# Altium footprint library LHAC-4XDSP2XV7-VP5_0226_3.PcbLib: 96 footprints (part 5 of 12)
Each footprint in its own frame and in the unit in brackets; x right, y up, seen from the top. Pads: shape width x height; smd on the part's side, far side on the other; paste and mask are expansions set on the pad; w line width, h text height; cw(c..) or ccw(c..) is an arc to the next point about the centre after c.
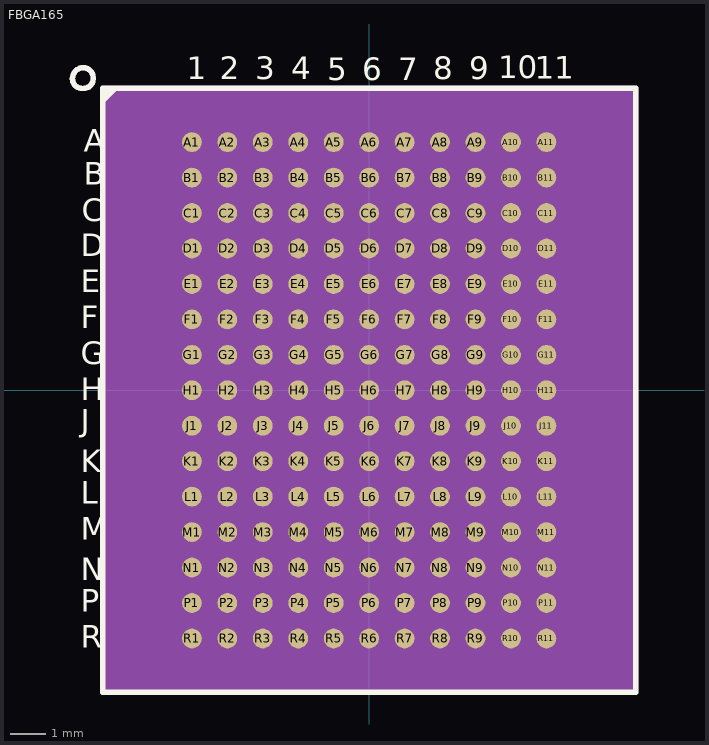
[diagram p4: the footprint, top view; thin cyan lines are the x and y axes]

## FBGA165 [mil] "FBGA165"
pads (165):
  round 22 smd: A1(-196.85,275.59) A2(-157.48,275.59) A3(-118.11,275.59) A4(-78.74,275.59) A5(-39.37,275.59) A6(0,275.59) A7(39.37,275.59) A8(78.74,275.59) A9(118.11,275.59) A10(157.48,275.59) A11(196.85,275.59) B1(-196.85,236.22) B2(-157.48,236.22) B3(-118.11,236.22) B4(-78.74,236.22) B5(-39.37,236.22) B6(0,236.22) B7(39.37,236.22) B8(78.74,236.22) B9(118.11,236.22) B10(157.48,236.22) B11(196.85,236.22) C1(-196.85,196.85) C2(-157.48,196.85) C3(-118.11,196.85) C4(-78.74,196.85) C5(-39.37,196.85) C6(0,196.85) C7(39.37,196.85) C8(78.74,196.85) C9(118.11,196.85) C10(157.48,196.85) C11(196.85,196.85) D1(-196.85,157.48) D2(-157.48,157.48) D3(-118.11,157.48) D4(-78.74,157.48) D5(-39.37,157.48) D6(0,157.48) D7(39.37,157.48) D8(78.74,157.48) D9(118.11,157.48) D10(157.48,157.48) D11(196.85,157.48) E1(-196.85,118.11) E2(-157.48,118.11) E3(-118.11,118.11) E4(-78.74,118.11) E5(-39.37,118.11) E6(0,118.11) E7(39.37,118.11) E8(78.74,118.11) E9(118.11,118.11) E10(157.48,118.11) E11(196.85,118.11) F1(-196.85,78.74) F2(-157.48,78.74) F3(-118.11,78.74) F4(-78.74,78.74) F5(-39.37,78.74) F6(0,78.74) F7(39.37,78.74) F8(78.74,78.74) F9(118.11,78.74) F10(157.48,78.74) F11(196.85,78.74) G1(-196.85,39.37) G2(-157.48,39.37) G3(-118.11,39.37) G4(-78.74,39.37) G5(-39.37,39.37) G6(0,39.37) G7(39.37,39.37) G8(78.74,39.37) G9(118.11,39.37) G10(157.48,39.37) G11(196.85,39.37) H1(-196.85,0) H2(-157.48,0) H3(-118.11,0) H4(-78.74,0) H5(-39.37,0) H6(0,0) H7(39.37,0) H8(78.74,0) H9(118.11,0) H10(157.48,0) H11(196.85,0) J1(-196.85,-39.37) J2(-157.48,-39.37) J3(-118.11,-39.37) J4(-78.74,-39.37) J5(-39.37,-39.37) J6(0,-39.37) J7(39.37,-39.37) J8(78.74,-39.37) J9(118.11,-39.37) J10(157.48,-39.37) J11(196.85,-39.37) K1(-196.85,-78.74) K2(-157.48,-78.74) K3(-118.11,-78.74) K4(-78.74,-78.74) K5(-39.37,-78.74) K6(0,-78.74) K7(39.37,-78.74) K8(78.74,-78.74) K9(118.11,-78.74) K10(157.48,-78.74) K11(196.85,-78.74) L1(-196.85,-118.11) L2(-157.48,-118.11) L3(-118.11,-118.11) L4(-78.74,-118.11) L5(-39.37,-118.11) L6(0,-118.11) L7(39.37,-118.11) L8(78.74,-118.11) L9(118.11,-118.11) L10(157.48,-118.11) L11(196.85,-118.11) M1(-196.85,-157.48) M2(-157.48,-157.48) M3(-118.11,-157.48) M4(-78.74,-157.48) M5(-39.37,-157.48) M6(0,-157.48) M7(39.37,-157.48) M8(78.74,-157.48) M9(118.11,-157.48) M10(157.48,-157.48) M11(196.85,-157.48) N1(-196.85,-196.85) N2(-157.48,-196.85) N3(-118.11,-196.85) N4(-78.74,-196.85) N5(-39.37,-196.85) N6(0,-196.85) N7(39.37,-196.85) N8(78.74,-196.85) N9(118.11,-196.85) N10(157.48,-196.85) N11(196.85,-196.85) P1(-196.85,-236.22) P2(-157.48,-236.22) P3(-118.11,-236.22) P4(-78.74,-236.22) P5(-39.37,-236.22) P6(0,-236.22) P7(39.37,-236.22) P8(78.74,-236.22) P9(118.11,-236.22) P10(157.48,-236.22) P11(196.85,-236.22) R1(-196.85,-275.59) R2(-157.48,-275.59) R3(-118.11,-275.59) R4(-78.74,-275.59) R5(-39.37,-275.59) R6(0,-275.59) R7(39.37,-275.59) R8(78.74,-275.59) R9(118.11,-275.59) R10(157.48,-275.59) R11(196.85,-275.59)
Top Overlay:
  lines w6: -294.4,323.9 -293.5,323.9 -282.2,335.2 ; -291.3,331.1 -295.48,335.28 -295.9,335.28 ; -295.9,335.28 -255.9,335.28 295.9,335.28 295.9,-335.28 -295.9,-335.28 -295.9,335.28 ; -329.53,346.17 ccw(c-318.53,346.17) -318.53,335.17 -317.53,335.17 ccw(c-317.53,346.17) -306.53,346.17 -306.53,347.17 ccw(c-317.53,347.17) -317.53,358.17 ccw(c-317.53,346.17) -329.53,346.17
  text "R" at -320.35,-285.91 h25
  text "P" at -320.35,-245.91 h25
  text "N" at -320.35,-210.91 h25
  text "M" at -320.35,-165.91 h25
  text "L" at -320.35,-125.91 h25
  text "K" at -320.35,-90.91 h25
  text "J" at -320.35,-45.91 h25
  text "H" at -320.35,-10.91 h25
  text "G" at -320.35,29.09 h25
  text "F" at -320.35,69.09 h25
  text "E" at -320.35,109.09 h25
  text "D" at -320.35,149.09 h25
  text "C" at -319,188 h25
  text "B" at -317,228 h25
  text "A" at -317,265 h25
  text "2" at -165.73,345.47 h25
  text "1" at -202.73,345.47 h25
  text "3" at -126.73,345.47 h25
  text "4" at -86.73,345.47 h25
  text "5" at -46.73,344.47 h25
  text "6" at -7.73,344.47 h25
  text "7" at 32.27,344.47 h25
  text "8" at 71.27,345.47 h25
  text "9" at 111.27,345.47 h25
  text "10" at 143.27,346.47 h25
  text "11" at 184,346 h25
Mechanical 5:
  lines w6: -294.4,323.9 -293.5,323.9 -282.2,335.2 ; -291.3,331.1 -295.48,335.28 -295.9,335.28 ; -295.9,335.28 -255.9,335.28 295.9,335.28 295.9,-335.28 -295.9,-335.28 -295.9,335.28 ; -329.53,346.17 cw(c-317.53,346.17) -317.53,358.17 cw(c-317.53,347.17) -306.53,347.17 -306.53,346.17 cw(c-317.53,346.17) -317.53,335.17 -318.53,335.17 cw(c-318.53,346.17) -329.53,346.17
  text "11" at 184,346 h25
  text "10" at 143.27,346.47 h25
  text "9" at 111.27,345.47 h25
  text "8" at 71.27,345.47 h25
  text "7" at 32.27,344.47 h25
  text "6" at -7.73,309.47 h25
  text "5" at -46.73,344.47 h25
  text "4" at -86.73,345.47 h25
  text "3" at -126.73,345.47 h25
  text "1" at -202.73,345.47 h25
  text "2" at -231.57,331.3 h25
  text "U13" at 310.68,-18.09 h25
  text "A" at -382.84,215.83 h25
  text "B" at -387,158 h25
  text "C" at -389,258 h25
  text "D" at -320.35,149.09 h25
  text "E" at -320.35,109.09 h25
  text "F" at -320.35,69.09 h25
  text "G" at -320.35,29.09 h25
  text "H" at -320.35,-10.91 h25
  text "J" at -390.35,-115.91 h25
  text "K" at -390.35,-160.91 h25
  text "L" at -390.35,-195.91 h25
  text "M" at -390.35,-235.91 h25
  text "N" at -390.35,-280.91 h25
  text "P" at -320.35,-245.91 h25
  text "R" at -320.35,-285.91 h25
Mechanical 14:
  text "J6" at -12,-39.37 h15
  text "G6" at -12,39.37 h15
  text "H6" at -12,0 h15
  text "E7" at 27.37,118.11 h15
  text "D7" at 27.37,157.48 h15
  text "E6" at -12,118.11 h15
  text "D5" at -51.37,157.48 h15
  text "D6" at -12,157.48 h15
  text "E5" at -51.37,118.11 h15
  text "D8" at 66.74,157.48 h15
  text "C8" at 66.74,196.85 h15
  text "F6" at -12,78.74 h15
  text "D4" at -90.74,157.48 h15
  text "C4" at -90.74,196.85 h15
  text "M8" at 66.74,-157.48 h15
  text "M7" at 27.37,-157.48 h15
  text "M6" at -12,-157.48 h15
  text "M5" at -51.37,-157.48 h15
  text "K6" at -12,-78.74 h15
  text "N8" at 66.74,-196.85 h15
  text "L7" at 27.37,-118.11 h15
  text "L6" at -12,-118.11 h15
  text "L5" at -51.37,-118.11 h15
  text "M4" at -90.74,-157.48 h15
  text "N4" at -90.74,-196.85 h15
  text "H10" at 139.48,0 h15
  text "H2" at -169.48,0 h15
  text "F8" at 66.74,78.74 h15
  text "E8" at 66.74,118.11 h15
  text "H9" at 106.11,0 h15
  text "J8" at 66.74,-39.37 h15
  text "G8" at 66.74,39.37 h15
  text "H8" at 66.74,0 h15
  text "E4" at -90.74,118.11 h15
  text "F4" at -90.74,78.74 h15
  text "J4" at -90.74,-39.37 h15
  text "H3" at -130.11,0 h15
  text "G4" at -90.74,39.37 h15
  text "H4" at -90.74,0 h15
  text "K8" at 66.74,-78.74 h15
  text "K4" at -90.74,-78.74 h15
  text "L8" at 66.74,-118.11 h15
  text "L4" at -90.74,-118.11 h15
  text "C6" at -12,196.85 h15
  text "G9" at 106.11,39.37 h15
  text "P9" at 106.11,-236.22 h15
  text "A2" at -169.48,275.59 h15
  text "D10" at 139.48,157.48 h15
  text "P6" at -12,-236.22 h15
  text "P2" at -169.48,-236.22 h15
  text "B9" at 106.11,236.22 h15
  text "A8" at 66.74,275.59 h15
  text "R1" at -208.85,-275.59 h15
  text "N7" at 27.37,-196.85 h15
  text "K11" at 178.85,-78.74 h15
  text "B6" at -12,236.22 h15
  text "L3" at -130.11,-118.11 h15
  text "C5" at -51.37,196.85 h15
  text "M10" at 139.48,-157.48 h15
  text "A7" at 27.37,275.59 h15
  text "M3" at -130.11,-157.48 h15
  text "K1" at -208.85,-78.74 h15
  text "G3" at -130.11,39.37 h15
  text "E9" at 106.11,118.11 h15
  text "P7" at 27.37,-236.22 h15
  text "J9" at 106.11,-39.37 h15
  text "C11" at 178.85,196.85 h15
  text "N1" at -208.85,-196.85 h15
  text "F2" at -169.48,78.74 h15
  text "C2" at -169.48,196.85 h15
  text "E11" at 178.85,118.11 h15
  text "E2" at -169.48,118.11 h15
  text "F3" at -130.11,78.74 h15
  text "P4" at -90.74,-236.22 h15
  text "A4" at -90.74,275.59 h15
  text "D11" at 178.85,157.48 h15
  text "K10" at 139.48,-78.74 h15
  text "E3" at -130.11,118.11 h15
  text "G10" at 139.48,39.37 h15
  text "B8" at 66.74,236.22 h15
  text "B1" at -208.85,236.22 h15
  text "F11" at 178.85,78.74 h15
  text "N3" at -130.11,-196.85 h15
  text "G1" at -208.85,39.37 h15
  text "L2" at -169.48,-118.11 h15
  text "A1" at -220.85,275.59 h15
  text "C7" at 27.37,196.85 h15
  text "E10" at 139.48,118.11 h15
  text "D1" at -208.85,157.48 h15
  text "P11" at 178.85,-236.22 h15
  text "F1" at -208.85,78.74 h15
  text "R4" at -90.74,-275.59 h15
  text "N6" at -12,-196.85 h15
  text "A5" at -51.37,275.59 h15
  text "R2" at -169.48,-275.59 h15
  text "R10" at 139.48,-275.59 h15
  text "K2" at -169.48,-78.74 h15
  text "P3" at -130.11,-236.22 h15
  text "R9" at 106.11,-275.59 h15
  text "M11" at 178.85,-157.48 h15
  text "B10" at 139.48,236.22 h15
  text "N11" at 178.85,-196.85 h15
  text "F9" at 106.11,78.74 h15
  text "N5" at -51.37,-196.85 h15
  text "J3" at -130.11,-39.37 h15
  text "E1" at -208.85,118.11 h15
  text "R11" at 178.85,-275.59 h15
  text "P8" at 66.74,-236.22 h15
  text "B4" at -90.74,236.22 h15
  text "J11" at 178.85,-39.37 h15
  text "M1" at -208.85,-157.48 h15
  text "L9" at 106.11,-118.11 h15
  text "B5" at -51.37,236.22 h15
  text "B7" at 27.37,236.22 h15
  text "A11" at 178.85,275.59 h15
  text "C1" at -208.85,196.85 h15
  text "M9" at 106.11,-157.48 h15
  text "R3" at -130.11,-275.59 h15
  text "R8" at 66.74,-275.59 h15
  text "B11" at 178.85,236.22 h15
  text "C3" at -130.11,196.85 h15
  text "H11" at 178.85,0 h15
  text "D3" at -130.11,157.48 h15
  text "B3" at -130.11,236.22 h15
  text "K3" at -130.11,-78.74 h15
  text "N9" at 106.11,-196.85 h15
  text "F10" at 139.48,78.74 h15
  text "B2" at -169.48,236.22 h15
  text "C10" at 139.48,196.85 h15
  text "G2" at -169.48,39.37 h15
  text "J1" at -208.85,-39.37 h15
  text "J10" at 139.48,-39.37 h15
  text "P5" at -51.37,-236.22 h15
  text "L10" at 139.48,-118.11 h15
  text "N10" at 139.48,-196.85 h15
  text "R5" at -51.37,-275.59 h15
  text "C9" at 106.11,196.85 h15
  text "A10" at 139.48,275.59 h15
  text "D2" at -169.48,157.48 h15
  text "L11" at 178.85,-118.11 h15
  text "P10" at 139.48,-236.22 h15
  text "P1" at -208.85,-236.22 h15
  text "L1" at -208.85,-118.11 h15
  text "D9" at 106.11,157.48 h15
  text "A6" at -12,275.59 h15
  text "R6" at -12,-275.59 h15
  text "R7" at 27.37,-275.59 h15
  text "A9" at 106.11,275.59 h15
  text "K9" at 106.11,-78.74 h15
  text "G11" at 178.85,39.37 h15
  text "H1" at -208.85,0 h15
  text "N2" at -169.48,-196.85 h15
  text "A3" at -130.11,275.59 h15
  text "M2" at -169.48,-157.48 h15
  text "J2" at -169.48,-39.37 h15
  text "G5" at -51.37,39.37 h15
  text "F5" at -51.37,78.74 h15
  text "G7" at 27.37,39.37 h15
  text "F7" at 27.37,78.74 h15
  text "J7" at 27.37,-39.37 h15
  text "J5" at -51.37,-39.37 h15
  text "H7" at 27.37,0 h15
  text "H5" at -51.37,0 h15
  text "K7" at 27.37,-78.74 h15
  text "K5" at -51.37,-78.74 h15
Mechanical 16:
  region: -295.9,335.28 -295.9,-335.28 295.9,-335.28 295.9,335.28
  lines w1: -253.73,295.47 ccw(c-253.73,306.47) -242.73,306.47 -242.73,307.47 ccw(c-252.73,307.47) -252.73,317.47 -253.73,317.47 ccw(c-253.73,307.47) -263.73,307.47 -263.73,306.47 ccw(c-252.73,306.47) -252.73,295.47
3D body: height 150, standoff 0, extent -295.9,-335.28 295.9,335.28